# Altium integrated library Rosenberger FAKRA.IntLib: 102 symbols (continued)
## 59S2UF-40MA5-G
designator P?
FaKrA Right Angle Plug, Edge Mount Pin in Paste, Upside Down, Coding G (Grey), Up to 6 GHz, -40 to 105 degC; PartNumber: 59S2UF-40MA5-G; Design Note: Footprint in library is a generic example - only application specific footprint delivers High Performance; DatasheetVersion: b00; PackageVersion: b00; PackageReference: 59S2UF-40MA5-G; PackageDescription: FaKra-HF Right Angle Plug, Edge Mount Pin in Paste, 23.1 x 9.3 x 5.45 mm; Coding: G (Grey); Mounting Technology: Pin-in-Paste; ComponentLink1Description: Manufacturer URL; ComponentLink1URL: http://www.rosenberger.de; ComponentLink2Description: Datasheet; ComponentLink2URL: http://rosenberger.de/ok/images/documents/db/59S2UF-40MA5-Y.pdf; ComponentLink3Description: Package Specification; ComponentLink3URL: http://rosenberger.de/ok/images/documents/db/59S2UF-40MA5-Y.pdf; ComponentLink4Description: Series Overview / Design Note; ComponentLink4URL: http://rosenberger.de/ok/images/documents/spez/59fakra.pdf; ComponentLink5Description: Webshop / RFQ; ComponentLink5URL: http://www.rosenberger.com/en/contact/sales/
footprint ROS-59S2UF-40MA5-G_V (FaKra-HF Right Angle Plug, Edge Mount Pin in Paste, 23.1x9.3x5.45mm, Rosenberger Recommended)
pins: 1, MH

## 59S2UF-40MA5-H
designator P?
FaKrA Right Angle Plug, Edge Mount Pin in Paste, Upside Down, Coding H (Violet), Up to 6 GHz, -40 to 105 degC; PartNumber: 59S2UF-40MA5-H; Design Note: Footprint in library is a generic example - only application specific footprint delivers High Performance; DatasheetVersion: b00; PackageVersion: b00; PackageReference: 59S2UF-40MA5-H; PackageDescription: FaKra-HF Right Angle Plug, Edge Mount Pin in Paste, 23.1 x 9.3 x 5.45 mm; Coding: H (Violet); Mounting Technology: Pin-in-Paste; ComponentLink1Description: Manufacturer URL; ComponentLink1URL: http://www.rosenberger.de; ComponentLink2Description: Datasheet; ComponentLink2URL: http://rosenberger.de/ok/images/documents/db/59S2UF-40MA5-Y.pdf; ComponentLink3Description: Package Specification; ComponentLink3URL: http://rosenberger.de/ok/images/documents/db/59S2UF-40MA5-Y.pdf; ComponentLink4Description: Series Overview / Design Note; ComponentLink4URL: http://rosenberger.de/ok/images/documents/spez/59fakra.pdf; ComponentLink5Description: Webshop / RFQ; ComponentLink5URL: http://www.rosenberger.com/en/contact/sales/
footprint ROS-59S2UF-40MA5-H_V (FaKra-HF Right Angle Plug, Edge Mount Pin in Paste, 23.1x9.3x5.45mm, Rosenberger Recommended)
pins: 1, MH

## 59S2UF-40MA5-I
designator P?
FaKrA Right Angle Plug, Edge Mount Pin in Paste, Upside Down, Coding I (Beige), Up to 6 GHz, -40 to 105 degC; PartNumber: 59S2UF-40MA5-I; Design Note: Footprint in library is a generic example - only application specific footprint delivers High Performance; DatasheetVersion: b00; PackageVersion: b00; PackageReference: 59S2UF-40MA5-I; PackageDescription: FaKra-HF Right Angle Plug, Edge Mount Pin in Paste, 23.1 x 9.3 x 5.45 mm; Coding: I (Beige); Mounting Technology: Pin-in-Paste; ComponentLink1Description: Manufacturer URL; ComponentLink1URL: http://www.rosenberger.de; ComponentLink2Description: Datasheet; ComponentLink2URL: http://rosenberger.de/ok/images/documents/db/59S2UF-40MA5-Y.pdf; ComponentLink3Description: Package Specification; ComponentLink3URL: http://rosenberger.de/ok/images/documents/db/59S2UF-40MA5-Y.pdf; ComponentLink4Description: Series Overview / Design Note; ComponentLink4URL: http://rosenberger.de/ok/images/documents/spez/59fakra.pdf; ComponentLink5Description: Webshop / RFQ; ComponentLink5URL: http://www.rosenberger.com/en/contact/sales/
footprint ROS-59S2UF-40MA5-I_V (FaKra-HF Right Angle Plug, Edge Mount Pin in Paste, 23.1x9.3x5.45mm, Rosenberger Recommended)
pins: 1, MH

## 59S2UF-40MA5-K
designator P?
FaKrA Right Angle Plug, Edge Mount Pin in Paste, Upside Down, Coding K (Curry), Up to 6 GHz, -40 to 105 degC; PartNumber: 59S2UF-40MA5-K; Design Note: Footprint in library is a generic example - only application specific footprint delivers High Performance; DatasheetVersion: b00; PackageVersion: b00; PackageReference: 59S2UF-40MA5-K; PackageDescription: FaKra-HF Right Angle Plug, Edge Mount Pin in Paste, 23.1 x 9.3 x 5.45 mm; Coding: K (Curry); Mounting Technology: Pin-in-Paste; ComponentLink1Description: Manufacturer URL; ComponentLink1URL: http://www.rosenberger.de; ComponentLink2Description: Datasheet; ComponentLink2URL: http://rosenberger.de/ok/images/documents/db/59S2UF-40MA5-Y.pdf; ComponentLink3Description: Package Specification; ComponentLink3URL: http://rosenberger.de/ok/images/documents/db/59S2UF-40MA5-Y.pdf; ComponentLink4Description: Series Overview / Design Note; ComponentLink4URL: http://rosenberger.de/ok/images/documents/spez/59fakra.pdf; ComponentLink5Description: Webshop / RFQ; ComponentLink5URL: http://www.rosenberger.com/en/contact/sales/
footprint ROS-59S2UF-40MA5-K_V (FaKra-HF Right Angle Plug, Edge Mount Pin in Paste, 23.1x9.3x5.45mm, Rosenberger Recommended)
pins: 1, MH

## 59S2UF-40MA5-L
designator P?
FaKrA Right Angle Plug, Edge Mount Pin in Paste, Upside Down, Coding L (Carmine-Red), Up to 6 GHz, -40 to 105 degC; PartNumber: 59S2UF-40MA5-L; Design Note: Footprint in library is a generic example - only application specific footprint delivers High Performance; DatasheetVersion: b00; PackageVersion: b00; PackageReference: 59S2UF-40MA5-L; PackageDescription: FaKra-HF Right Angle Plug, Edge Mount Pin in Paste, 23.1 x 9.3 x 5.45 mm; Coding: L (Carmine-red); Mounting Technology: Pin-in-Paste; ComponentLink1Description: Manufacturer URL; ComponentLink1URL: http://www.rosenberger.de; ComponentLink2Description: Datasheet; ComponentLink2URL: http://rosenberger.de/ok/images/documents/db/59S2UF-40MA5-Y.pdf; ComponentLink3Description: Package Specification; ComponentLink3URL: http://rosenberger.de/ok/images/documents/db/59S2UF-40MA5-Y.pdf; ComponentLink4Description: Series Overview / Design Note; ComponentLink4URL: http://rosenberger.de/ok/images/documents/spez/59fakra.pdf; ComponentLink5Description: Webshop / RFQ; ComponentLink5URL: http://www.rosenberger.com/en/contact/sales/
footprint ROS-59S2UF-40MA5-L_V (FaKra-HF Right Angle Plug, Edge Mount Pin in Paste, 23.1x9.3x5.45mm, Rosenberger Recommended)
pins: 1, MH

## 59S2UF-40MA5-Z
designator P?
FaKrA Right Angle Plug, Edge Mount Pin in Paste, Upside Down, Coding Z (Waterblue), Up to 6 GHz, -40 to 105 degC; PartNumber: 59S2UF-40MA5-Z; Design Note: Footprint in library is a generic example - only application specific footprint delivers High Performance; DatasheetVersion: b00; PackageVersion: b00; PackageReference: 59S2UF-40MA5-Z; PackageDescription: FaKra-HF Right Angle Plug, Edge Mount Pin in Paste, 23.1 x 9.3 x 5.45 mm; Coding: Z (Waterblue); Mounting Technology: Pin-in-Paste; ComponentLink1Description: Manufacturer URL; ComponentLink1URL: http://www.rosenberger.de; ComponentLink2Description: Datasheet; ComponentLink2URL: http://rosenberger.de/ok/images/documents/db/59S2UF-40MA5-Y.pdf; ComponentLink3Description: Package Specification; ComponentLink3URL: http://rosenberger.de/ok/images/documents/db/59S2UF-40MA5-Y.pdf; ComponentLink4Description: Series Overview / Design Note; ComponentLink4URL: http://rosenberger.de/ok/images/documents/spez/59fakra.pdf; ComponentLink5Description: Webshop / RFQ; ComponentLink5URL: http://www.rosenberger.com/en/contact/sales/
footprint ROS-59S2UF-40MA5-Z_V (FaKra-HF Right Angle Plug, Edge Mount Pin in Paste, 23.1x9.3x5.45mm, Rosenberger Recommended)
pins: 1, MH

## 59S2UQ-40MT5-C
designator P?
FaKrA Right Angle Plug, Edge Mount Pin in Paste, Upside Down, Coding C (Blue), Up to 6 GHz, -40 to 105 degC; PartNumber: 59S2UQ-40MT5-C; Design Note: Footprint in library is a generic example - only application specific footprint delivers High Performance; DatasheetVersion: c00; PackageVersion: c00; PackageReference: 59S2UQ-40MT5-C; PackageDescription: FaKrA-HF Right Angle Plug, Edge Mount Pin in Paste, 8.5 x 22.65 x 3.8 mm; Coding: C (Blue); Mounting Technology: Pin-in-Paste; ComponentLink1Description: Manufacturer URL; ComponentLink1URL: http://www.rosenberger.de; ComponentLink2Description: Datasheet; ComponentLink2URL: http://rosenberger.de/ok/images/documents/db/59S2UQ-40MT5-Y.pdf; ComponentLink3Description: Package Specification; ComponentLink3URL: http://rosenberger.de/ok/images/documents/db/59S2UQ-40MT5-Y.pdf; ComponentLink4Description: Webshop / RFQ; ComponentLink4URL: http://www.rosenberger.com/en/contact/sales/
footprint ROS-59S2UQ-40MT5-I_V (FaKrA-HF Right Angle Plug, Edge Mount Pin in Paste, 8.5x22.65x3.8mm, Rosenberger Recommended)
pins: 1, MH

## 59S2UQ-40MT5-I
designator P?
FaKrA Right Angle Plug, Edge Mount Pin in Paste, Upside Down, Coding I (Beige), Up to 6 GHz, -40 to 105 degC; PartNumber: 59S2UQ-40MT5-I; Design Note: Footprint in library is a generic example - only application specific footprint delivers High Performance; DatasheetVersion: c00; PackageVersion: c00; PackageReference: 59S2UQ-40MT5-I; PackageDescription: FaKrA-HF Right Angle Plug, Edge Mount Pin in Paste, 8.5 x 22.65 x 3.8 mm; Coding: I (Beige); Mounting Technology: Pin-in-Paste; ComponentLink1Description: Manufacturer URL; ComponentLink1URL: http://www.rosenberger.de; ComponentLink2Description: Datasheet; ComponentLink2URL: http://rosenberger.de/ok/images/documents/db/59S2UQ-40MT5-Y.pdf; ComponentLink3Description: Package Specification; ComponentLink3URL: http://rosenberger.de/ok/images/documents/db/59S2UQ-40MT5-Y.pdf; ComponentLink4Description: Webshop / RFQ; ComponentLink4URL: http://www.rosenberger.com/en/contact/sales/
footprint ROS-59S2UQ-40MT5-C_V (FaKrA-HF Right Angle Plug, Edge Mount Pin in Paste, 8.5x22.65x3.8mm, Rosenberger Recommended)
pins: 1, MH

## 59S2UQ-40MT5-K
designator P?
FaKrA Right Angle Plug, Edge Mount Pin in Paste, Upside Down, Coding K (Curry), Up to 6 GHz, -40 to 105 degC; PartNumber: 59S2UQ-40MT5-K; Design Note: Footprint in library is a generic example - only application specific footprint delivers High Performance; DatasheetVersion: c00; PackageVersion: c00; PackageReference: 59S2UQ-40MT5-K; PackageDescription: FaKrA-HF Right Angle Plug, Edge Mount Pin in Paste, 8.5 x 22.65 x 3.8 mm; Coding: K (Curry); Mounting Technology: Pin-in-Paste; ComponentLink1Description: Manufacturer URL; ComponentLink1URL: http://www.rosenberger.de; ComponentLink2Description: Datasheet; ComponentLink2URL: http://rosenberger.de/ok/images/documents/db/59S2UQ-40MT5-Y.pdf; ComponentLink3Description: Package Specification; ComponentLink3URL: http://rosenberger.de/ok/images/documents/db/59S2UQ-40MT5-Y.pdf; ComponentLink4Description: Webshop / RFQ; ComponentLink4URL: http://www.rosenberger.com/en/contact/sales/
footprint ROS-59S2UQ-40MT5-K_V (FaKrA-HF Right Angle Plug, Edge Mount Pin in Paste, 8.5x22.65x3.8mm, Rosenberger Recommended)
pins: 1, MH

## 59S2UQ-40MT5-Z
designator P?
FaKrA Right Angle Plug, Edge Mount Pin in Paste, Upside Down, Coding Z (Waterblue), Up to 6 GHz, -40 to 105 degC; PartNumber: 59S2UQ-40MT5-Z; Coding: Z (Waterbule); Design Note: Footprint in library is a generic example - only application specific footprint delivers High Performance; DatasheetVersion: c00; PackageVersion: c00; PackageReference: 59S2UQ-40MT5-Z; PackageDescription: FaKrA-HF Right Angle Plug, Edge Mount Pin in Paste, 8.5 x 22.65 x 3.8 mm; Mounting Technology: Pin-in-Paste; ComponentLink1Description: Manufacturer URL; ComponentLink1URL: http://www.rosenberger.de; ComponentLink2Description: Datasheet; ComponentLink2URL: http://rosenberger.de/ok/images/documents/db/59S2UQ-40MT5-Y.pdf; ComponentLink3Description: Package Specification; ComponentLink3URL: http://rosenberger.de/ok/images/documents/db/59S2UQ-40MT5-Y.pdf; ComponentLink4Description: Webshop / RFQ; ComponentLink4URL: http://www.rosenberger.com/en/contact/sales/
footprint ROS-59S2UQ-40MT5-Z_V (FaKrA-HF Right Angle Plug, Edge Mount Pin in Paste, 8.5x22.65x3.8mm, Rosenberger Recommended)
pins: 1, MH

## 59S20X-400L5-A
designator P?
FaKrA Right Angle Plug, Pin in Paste, Coding A (Black), Up to 6 GHz, -40 to 105 degC; PartNumber: 59S20X-400L5-A; Design Note: Footprint in library is a generic example - only application specific footprint delivers High Performance; DatasheetVersion: j00; PackageVersion: j00; PackageReference: 59S20X-400L5-A; PackageDescription: FaKrA Right Angle Plug, Pin in Paste, 16.6 x 8.5 x 9.4 mm; Coding: A (Black); Mounting Technology: Pin-in-Paste; ComponentLink1Description: Manufacturer URL; ComponentLink1URL: http://www.rosenberger.de; ComponentLink2Description: Datasheet; ComponentLink2URL: http://rosenberger.de/ok/images/documents/db/59S20X-400L5-Y.pdf; ComponentLink3Description: Package Specification; ComponentLink3URL: http://rosenberger.de/ok/images/documents/db/59S20X-400L5-Y.pdf; ComponentLink4Description: Series Overview / Design Note; ComponentLink4URL: http://rosenberger.de/ok/images/documents/spez/59fakra.pdf; ComponentLink5Description: Webshop / RFQ; ComponentLink5URL: http://www.rosenberger.com/en/contact/sales/
footprint ROS-59S20X-400L5-A_V (FaKrA Right Angle Plug, Pin in Paste, 16.6x8.5x9.4mm, Rosenberger Recommended)
pins: 1, MH

## 59S20X-400L5-B
designator P?
FaKrA Right Angle Plug, Pin in Paste, Coding B (White), Up to 6 GHz, -40 to 105 degC; PartNumber: 59S20X-400L5-B; Design Note: Footprint in library is a generic example - only application specific footprint delivers High Performance; DatasheetVersion: j00; PackageVersion: j00; PackageReference: 59S20X-400L5-B; PackageDescription: FaKrA Right Angle Plug, Pin in Paste, 16.6 x 8.5 x 9.4 mm; Coding: B (White); Mounting Technology: Pin-in-Paste; ComponentLink1Description: Manufacturer URL; ComponentLink1URL: http://www.rosenberger.de; ComponentLink2Description: Datasheet; ComponentLink2URL: http://rosenberger.de/ok/images/documents/db/59S20X-400L5-Y.pdf; ComponentLink3Description: Package Specification; ComponentLink3URL: http://rosenberger.de/ok/images/documents/db/59S20X-400L5-Y.pdf; ComponentLink4Description: Series Overview / Design Note; ComponentLink4URL: http://rosenberger.de/ok/images/documents/spez/59fakra.pdf; ComponentLink5Description: Webshop / RFQ; ComponentLink5URL: http://www.rosenberger.com/en/contact/sales/
footprint ROS-59S20X-400L5-B_V (FaKrA Right Angle Plug, Pin in Paste, 16.6x8.5x9.4mm, Rosenberger Recommended)
pins: 1, MH

## 59S20X-400L5-C
designator P?
FaKrA Right Angle Plug, Pin in Paste, Coding C (Blue), Up to 6 GHz, -40 to 105 degC; PartNumber: 59S20X-400L5-C; Design Note: Footprint in library is a generic example - only application specific footprint delivers High Performance; DatasheetVersion: j00; PackageVersion: j00; PackageReference: 59S20X-400L5-C; PackageDescription: FaKrA Right Angle Plug, Pin in Paste, 16.6 x 8.5 x 9.4 mm; Coding: C (Blue); Mounting Technology: Pin-in-Paste; ComponentLink1Description: Manufacturer URL; ComponentLink1URL: http://www.rosenberger.de; ComponentLink2Description: Datasheet; ComponentLink2URL: http://rosenberger.de/ok/images/documents/db/59S20X-400L5-Y.pdf; ComponentLink3Description: Package Specification; ComponentLink3URL: http://rosenberger.de/ok/images/documents/db/59S20X-400L5-Y.pdf; ComponentLink4Description: Series Overview / Design Note; ComponentLink4URL: http://rosenberger.de/ok/images/documents/spez/59fakra.pdf; ComponentLink5Description: Webshop / RFQ; ComponentLink5URL: http://www.rosenberger.com/en/contact/sales/
footprint ROS-59S20X-400L5-C_V (FaKrA Right Angle Plug, Pin in Paste, 16.6x8.5x9.4mm, Rosenberger Recommended)
pins: 1, MH

## 59S20X-400L5-D
designator P?
FaKrA Right Angle Plug, Pin in Paste, Coding D (Bordeauxviolet), Up to 6 GHz, -40 to 105 degC; PartNumber: 59S20X-400L5-D; Design Note: Footprint in library is a generic example - only application specific footprint delivers High Performance; DatasheetVersion: j00; PackageVersion: j00; PackageReference: 59S20X-400L5-D; PackageDescription: FaKrA Right Angle Plug, Pin in Paste, 16.6 x 8.5 x 9.4 mm; Coding: D (Bordeauxviolet); Mounting Technology: Pin-in-Paste; ComponentLink1Description: Manufacturer URL; ComponentLink1URL: http://www.rosenberger.de; ComponentLink2Description: Datasheet; ComponentLink2URL: http://rosenberger.de/ok/images/documents/db/59S20X-400L5-Y.pdf; ComponentLink3Description: Package Specification; ComponentLink3URL: http://rosenberger.de/ok/images/documents/db/59S20X-400L5-Y.pdf; ComponentLink4Description: Series Overview / Design Note; ComponentLink4URL: http://rosenberger.de/ok/images/documents/spez/59fakra.pdf; ComponentLink5Description: Webshop / RFQ; ComponentLink5URL: http://www.rosenberger.com/en/contact/sales/
footprint ROS-59S20X-400L5-D_V (FaKrA Right Angle Plug, Pin in Paste, 16.6x8.5x9.4mm, Rosenberger Recommended)
pins: 1, MH

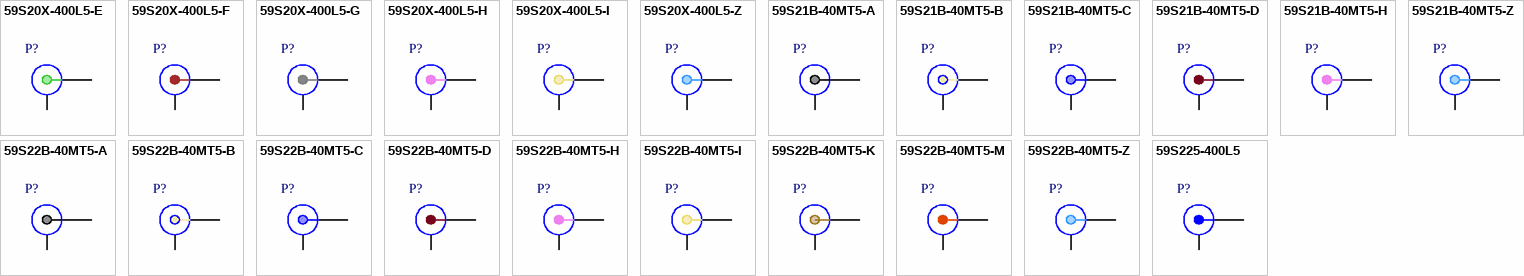
[diagram p2: symbols 59S20X-400L5-E to 59S225-400L5]

## 59S20X-400L5-E
designator P?
FaKrA Right Angle Plug, Pin in Paste, Coding E (Green), Up to 6 GHz, -40 to 105 degC; PartNumber: 59S20X-400L5-E; Design Note: Footprint in library is a generic example - only application specific footprint delivers High Performance; DatasheetVersion: j00; PackageVersion: j00; PackageReference: 59S20X-400L5-E; PackageDescription: FaKrA Right Angle Plug, Pin in Paste, 16.6 x 8.5 x 9.4 mm; Coding: E (Green); Mounting Technology: Pin-in-Paste; ComponentLink1Description: Manufacturer URL; ComponentLink1URL: http://www.rosenberger.de; ComponentLink2Description: Datasheet; ComponentLink2URL: http://rosenberger.de/ok/images/documents/db/59S20X-400L5-Y.pdf; ComponentLink3Description: Package Specification; ComponentLink3URL: http://rosenberger.de/ok/images/documents/db/59S20X-400L5-Y.pdf; ComponentLink4Description: Series Overview / Design Note; ComponentLink4URL: http://rosenberger.de/ok/images/documents/spez/59fakra.pdf; ComponentLink5Description: Webshop / RFQ; ComponentLink5URL: http://www.rosenberger.com/en/contact/sales/
footprint ROS-59S20X-400L5-E_V (FaKrA Right Angle Plug, Pin in Paste, 16.6x8.5x9.4mm, Rosenberger Recommended)
pins: 1, MH

## 59S20X-400L5-F
designator P?
FaKrA Right Angle Plug, Pin in Paste, Coding F (Brown), Up to 6 GHz, -40 to 105 degC; PartNumber: 59S20X-400L5-F; Design Note: Footprint in library is a generic example - only application specific footprint delivers High Performance; DatasheetVersion: j00; PackageVersion: j00; PackageReference: 59S20X-400L5-F; PackageDescription: FaKrA Right Angle Plug, Pin in Paste, 16.6 x 8.5 x 9.4 mm; Coding: F (Brown); Mounting Technology: Pin-in-Paste; ComponentLink1Description: Manufacturer URL; ComponentLink1URL: http://www.rosenberger.de; ComponentLink2Description: Datasheet; ComponentLink2URL: http://rosenberger.de/ok/images/documents/db/59S20X-400L5-Y.pdf; ComponentLink3Description: Package Specification; ComponentLink3URL: http://rosenberger.de/ok/images/documents/db/59S20X-400L5-Y.pdf; ComponentLink4Description: Series Overview / Design Note; ComponentLink4URL: http://rosenberger.de/ok/images/documents/spez/59fakra.pdf; ComponentLink5Description: Webshop / RFQ; ComponentLink5URL: http://www.rosenberger.com/en/contact/sales/
footprint ROS-59S20X-400L5-F_V (FaKrA Right Angle Plug, Pin in Paste, 16.6x8.5x9.4mm, Rosenberger Recommended)
pins: 1, MH

## 59S20X-400L5-G
designator P?
FaKrA Right Angle Plug, Pin in Paste, Coding G (Grey), Up to 6 GHz, -40 to 105 degC; PartNumber: 59S20X-400L5-G; Design Note: Footprint in library is a generic example - only application specific footprint delivers High Performance; DatasheetVersion: j00; PackageVersion: j00; PackageReference: 59S20X-400L5-G; PackageDescription: FaKrA Right Angle Plug, Pin in Paste, 16.6 x 8.5 x 9.4 mm; Coding: G (Grey); Mounting Technology: Pin-in-Paste; ComponentLink1Description: Manufacturer URL; ComponentLink1URL: http://www.rosenberger.de; ComponentLink2Description: Datasheet; ComponentLink2URL: http://rosenberger.de/ok/images/documents/db/59S20X-400L5-Y.pdf; ComponentLink3Description: Package Specification; ComponentLink3URL: http://rosenberger.de/ok/images/documents/db/59S20X-400L5-Y.pdf; ComponentLink4Description: Series Overview / Design Note; ComponentLink4URL: http://rosenberger.de/ok/images/documents/spez/59fakra.pdf; ComponentLink5Description: Webshop / RFQ; ComponentLink5URL: http://www.rosenberger.com/en/contact/sales/
footprint ROS-59S20X-400L5-G_V (FaKrA Right Angle Plug, Pin in Paste, 16.6x8.5x9.4mm, Rosenberger Recommended)
pins: 1, MH

## 59S20X-400L5-H
designator P?
FaKrA Right Angle Plug, Pin in Paste, Coding H (Violet), Up to 6 GHz, -40 to 105 degC; PartNumber: 59S20X-400L5-H; Design Note: Footprint in library is a generic example - only application specific footprint delivers High Performance; DatasheetVersion: j00; PackageVersion: j00; PackageReference: 59S20X-400L5-H; PackageDescription: FaKrA Right Angle Plug, Pin in Paste, 16.6 x 8.5 x 9.4 mm; Coding: H (Violet); Mounting Technology: Pin-in-Paste; ComponentLink1Description: Manufacturer URL; ComponentLink1URL: http://www.rosenberger.de; ComponentLink2Description: Datasheet; ComponentLink2URL: http://rosenberger.de/ok/images/documents/db/59S20X-400L5-Y.pdf; ComponentLink3Description: Package Specification; ComponentLink3URL: http://rosenberger.de/ok/images/documents/db/59S20X-400L5-Y.pdf; ComponentLink4Description: Series Overview / Design Note; ComponentLink4URL: http://rosenberger.de/ok/images/documents/spez/59fakra.pdf; ComponentLink5Description: Webshop / RFQ; ComponentLink5URL: http://www.rosenberger.com/en/contact/sales/
footprint ROS-59S20X-400L5-H_V (FaKrA Right Angle Plug, Pin in Paste, 16.6x8.5x9.4mm, Rosenberger Recommended)
pins: 1, MH

## 59S20X-400L5-I
designator P?
FaKrA Right Angle Plug, Pin in Paste, Coding I (Beige), Up to 6 GHz, -40 to 105 degC; PartNumber: 59S20X-400L5-I; Design Note: Footprint in library is a generic example - only application specific footprint delivers High Performance; DatasheetVersion: j00; PackageVersion: j00; PackageReference: 59S20X-400L5-I; PackageDescription: FaKrA Right Angle Plug, Pin in Paste, 16.6 x 8.5 x 9.4 mm; Coding: I (Beige); Mounting Technology: Pin-in-Paste; ComponentLink1Description: Manufacturer URL; ComponentLink1URL: http://www.rosenberger.de; ComponentLink2Description: Datasheet; ComponentLink2URL: http://rosenberger.de/ok/images/documents/db/59S20X-400L5-Y.pdf; ComponentLink3Description: Package Specification; ComponentLink3URL: http://rosenberger.de/ok/images/documents/db/59S20X-400L5-Y.pdf; ComponentLink4Description: Series Overview / Design Note; ComponentLink4URL: http://rosenberger.de/ok/images/documents/spez/59fakra.pdf; ComponentLink5Description: Webshop / RFQ; ComponentLink5URL: http://www.rosenberger.com/en/contact/sales/
footprint ROS-59S20X-400L5-I_V (FaKrA Right Angle Plug, Pin in Paste, 16.6x8.5x9.4mm, Rosenberger Recommended)
pins: 1, MH

## 59S20X-400L5-Z
designator P?
FaKrA Right Angle Plug, Pin in Paste, Coding Z (Waterblue), Up to 6 GHz, -40 to 105 degC; PartNumber: 59S20X-400L5-Z; Design Note: Footprint in library is a generic example - only application specific footprint delivers High Performance; DatasheetVersion: j00; PackageVersion: j00; PackageReference: 59S20X-400L5-Z; PackageDescription: FaKrA Right Angle Plug, Pin in Paste, 16.6 x 8.5 x 9.4 mm; Coding: Z (Waterblue); Mounting Technology: Pin-in-Paste; ComponentLink1Description: Manufacturer URL; ComponentLink1URL: http://www.rosenberger.de; ComponentLink2Description: Datasheet; ComponentLink2URL: http://rosenberger.de/ok/images/documents/db/59S20X-400L5-Y.pdf; ComponentLink3Description: Package Specification; ComponentLink3URL: http://rosenberger.de/ok/images/documents/db/59S20X-400L5-Y.pdf; ComponentLink4Description: Series Overview / Design Note; ComponentLink4URL: http://rosenberger.de/ok/images/documents/spez/59fakra.pdf; ComponentLink5Description: Webshop / RFQ; ComponentLink5URL: http://www.rosenberger.com/en/contact/sales/
footprint ROS-59S20X-400L5-Z_V (FaKrA Right Angle Plug, Pin in Paste, 16.6x8.5x9.4mm, Rosenberger Recommended)
pins: 1, MH

## 59S21B-40MT5-A
designator P?
FaKrA Right Angle Plug, Edge Mount Pin in Paste, Upside Down, Coding A (Black), Up to 6 GHz, -40 to 105 degC; PartNumber: 59S21B-40MT5-A; Design Note: Footprint in library is a generic example - only application specific footprint delivers High Performance; DatasheetVersion: a00; PackageVersion: a00; PackageReference: 59S21B-40MT5-A; PackageDescription: FaKrA Right Angle Plug, Edge Mount Pin in Paste, 22.75 x 8 x 9.8 mm; Coding: A (Black); Mounting Technology: Pin-in-Paste; ComponentLink1Description: Manufacturer URL; ComponentLink1URL: http://www.rosenberger.de; ComponentLink2Description: Datasheet; ComponentLink2URL: http://rosenberger.de/ok/images/documents/db/59S21B-40MT5-Y.pdf; ComponentLink3Description: Package Specification; ComponentLink3URL: http://rosenberger.de/ok/images/documents/db/59S21B-40MT5-Y.pdf; ComponentLink4Description: Series Overview / Design Note; ComponentLink4URL: http://rosenberger.de/ok/images/documents/spez/59fakra.pdf; ComponentLink5Description: Webshop / RFQ; ComponentLink5URL: http://www.rosenberger.com/en/contact/sales/
footprint ROS-59S21B-40MT5-A_V (FaKrA Right Angle Plug, Edge Mount Pin in Paste, 22.75x8x9.8mm, Rosenberger Recommended)
pins: 1, MH

## 59S21B-40MT5-B
designator P?
FaKrA Right Angle Plug, Edge Mount Pin in Paste, Upside Down, Coding B (White), Up to 6 GHz, -40 to 105 degC; PartNumber: 59S21B-40MT5-B; Design Note: Footprint in library is a generic example - only application specific footprint delivers High Performance; DatasheetVersion: a00; PackageVersion: a00; PackageReference: 59S21B-40MT5-B; PackageDescription: FaKrA Right Angle Plug, Edge Mount Pin in Paste, 22.75 x 8 x 9.8 mm; Coding: B (White); Mounting Technology: Pin-in-Paste; ComponentLink1Description: Manufacturer URL; ComponentLink1URL: http://www.rosenberger.de; ComponentLink2Description: Datasheet; ComponentLink2URL: http://rosenberger.de/ok/images/documents/db/59S21B-40MT5-Y.pdf; ComponentLink3Description: Package Specification; ComponentLink3URL: http://rosenberger.de/ok/images/documents/db/59S21B-40MT5-Y.pdf; ComponentLink4Description: Series Overview / Design Note; ComponentLink4URL: http://rosenberger.de/ok/images/documents/spez/59fakra.pdf; ComponentLink5Description: Webshop / RFQ; ComponentLink5URL: http://www.rosenberger.com/en/contact/sales/
footprint ROS-59S21B-40MT5-B_V (FaKrA Right Angle Plug, Edge Mount Pin in Paste, 22.75x8x9.8mm, Rosenberger Recommended)
pins: 1, MH

## 59S21B-40MT5-C
designator P?
FaKrA Right Angle Plug, Edge Mount Pin in Paste, Upside Down, Coding C (Blue), Up to 6 GHz, -40 to 105 degC; PartNumber: 59S21B-40MT5-C; Design Note: Footprint in library is a generic example - only application specific footprint delivers High Performance; DatasheetVersion: a00; PackageVersion: a00; PackageReference: 59S21B-40MT5-C; PackageDescription: FaKrA Right Angle Plug, Edge Mount Pin in Paste, 22.75 x 8 x 9.8 mm; Coding: C (Blue); Mounting Technology: Pin-in-Paste; ComponentLink1Description: Manufacturer URL; ComponentLink1URL: http://www.rosenberger.de; ComponentLink2Description: Datasheet; ComponentLink2URL: http://rosenberger.de/ok/images/documents/db/59S21B-40MT5-Y.pdf; ComponentLink3Description: Package Specification; ComponentLink3URL: http://rosenberger.de/ok/images/documents/db/59S21B-40MT5-Y.pdf; ComponentLink4Description: Series Overview / Design Note; ComponentLink4URL: http://rosenberger.de/ok/images/documents/spez/59fakra.pdf; ComponentLink5Description: Webshop / RFQ; ComponentLink5URL: http://www.rosenberger.com/en/contact/sales/
footprint ROS-59S21B-40MT5-C_V (FaKrA Right Angle Plug, Edge Mount Pin in Paste, 22.75x8x9.8mm, Rosenberger Recommended)
pins: 1, MH

## 59S21B-40MT5-D
designator P?
FaKrA Right Angle Plug, Edge Mount Pin in Paste, Upside Down, Coding D (Bordeauxviolet), Up to 6 GHz, -40 to 105 degC; PartNumber: 59S21B-40MT5-D; Design Note: Footprint in library is a generic example - only application specific footprint delivers High Performance; DatasheetVersion: a00; PackageVersion: a00; PackageReference: 59S21B-40MT5-D; PackageDescription: FaKrA Right Angle Plug, Edge Mount Pin in Paste, 22.75 x 8 x 9.8 mm; Coding: D (Bordeauxviolet); Mounting Technology: Pin-in-Paste; ComponentLink1Description: Manufacturer URL; ComponentLink1URL: http://www.rosenberger.de; ComponentLink2Description: Datasheet; ComponentLink2URL: http://rosenberger.de/ok/images/documents/db/59S21B-40MT5-Y.pdf; ComponentLink3Description: Package Specification; ComponentLink3URL: http://rosenberger.de/ok/images/documents/db/59S21B-40MT5-Y.pdf; ComponentLink4Description: Series Overview / Design Note; ComponentLink4URL: http://rosenberger.de/ok/images/documents/spez/59fakra.pdf; ComponentLink5Description: Webshop / RFQ; ComponentLink5URL: http://www.rosenberger.com/en/contact/sales/
footprint ROS-59S21B-40MT5-D_V (FaKrA Right Angle Plug, Edge Mount Pin in Paste, 22.75x8x9.8mm, Rosenberger Recommended)
pins: 1, MH

## 59S21B-40MT5-H
designator P?
FaKrA Right Angle Plug, Edge Mount Pin in Paste, Upside Down, Coding H (Violet), Up to 6 GHz, -40 to 105 degC; PartNumber: 59S21B-40MT5-H; Design Note: Footprint in library is a generic example - only application specific footprint delivers High Performance; DatasheetVersion: a00; PackageVersion: a00; PackageReference: 59S21B-40MT5-H; PackageDescription: FaKrA Right Angle Plug, Edge Mount Pin in Paste, 22.75 x 8 x 9.8 mm; Coding: H (Violet); Mounting Technology: Pin-in-Paste; ComponentLink1Description: Manufacturer URL; ComponentLink1URL: http://www.rosenberger.de; ComponentLink2Description: Datasheet; ComponentLink2URL: http://rosenberger.de/ok/images/documents/db/59S21B-40MT5-Y.pdf; ComponentLink3Description: Package Specification; ComponentLink3URL: http://rosenberger.de/ok/images/documents/db/59S21B-40MT5-Y.pdf; ComponentLink4Description: Series Overview / Design Note; ComponentLink4URL: http://rosenberger.de/ok/images/documents/spez/59fakra.pdf; ComponentLink5Description: Webshop / RFQ; ComponentLink5URL: http://www.rosenberger.com/en/contact/sales/
footprint ROS-59S21B-40MT5-H_V (FaKrA Right Angle Plug, Edge Mount Pin in Paste, 22.75x8x9.8mm, Rosenberger Recommended)
pins: 1, MH

## 59S21B-40MT5-Z
designator P?
FaKrA Right Angle Plug, Edge Mount Pin in Paste, Upside Down, Coding Z (Waterblue), Up to 6 GHz, -40 to 105 degC; PartNumber: 59S21B-40MT5-Z; Design Note: Footprint in library is a generic example - only application specific footprint delivers High Performance; DatasheetVersion: a00; PackageVersion: a00; PackageReference: 59S21B-40MT5-Z; PackageDescription: FaKrA Right Angle Plug, Edge Mount Pin in Paste, 22.75 x 8 x 9.8 mm; Coding: Z (Waterblue); Mounting Technology: Pin-in-Paste; ComponentLink1Description: Manufacturer URL; ComponentLink1URL: http://www.rosenberger.de; ComponentLink2Description: Datasheet; ComponentLink2URL: http://rosenberger.de/ok/images/documents/db/59S21B-40MT5-Y.pdf; ComponentLink3Description: Package Specification; ComponentLink3URL: http://rosenberger.de/ok/images/documents/db/59S21B-40MT5-Y.pdf; ComponentLink4Description: Series Overview / Design Note; ComponentLink4URL: http://rosenberger.de/ok/images/documents/spez/59fakra.pdf; ComponentLink5Description: Webshop / RFQ; ComponentLink5URL: http://www.rosenberger.com/en/contact/sales/
footprint ROS-59S21B-40MT5-Z_V (FaKrA Right Angle Plug, Edge Mount Pin in Paste, 22.75x8x9.8mm, Rosenberger Recommended)
pins: 1, MH

## 59S22B-40MT5-A
designator P?
FaKrA Right Angle Plug, Pin in Paste, Coding A (Black), Up to 6 GHz, -40 to 105 degC; PartNumber: 59S22B-40MT5-A; Design Note: Footprint in library is a generic example - only application specific footprint delivers High Performance; DatasheetVersion: b00; PackageVersion: b00; PackageReference: 59S22B-40MT5-A; PackageDescription: FaKra-HF Right Angle Plug, Pin in Paste, 22.75 x 8 x 9.8 mm; Coding: A (Black); Mounting Technology: Pin-in-Paste; ComponentLink1Description: Manufacturer URL; ComponentLink1URL: http://www.rosenberger.de; ComponentLink2Description: Datasheet; ComponentLink2URL: http://rosenberger.de/ok/images/documents/db/59S22B-40MT5-Y.pdf; ComponentLink3Description: Package Specification; ComponentLink3URL: http://rosenberger.de/ok/images/documents/db/59S22B-40MT5-Y.pdf; ComponentLink4Description: Series Overview / Design Note; ComponentLink4URL: http://rosenberger.de/ok/images/documents/spez/59fakra.pdf; ComponentLink5Description: Webshop / RFQ; ComponentLink5URL: http://www.rosenberger.com/en/contact/sales/
footprint ROS-59S22B-40MT5-A_V (FaKra-HF Right Angle Plug, Pin in Paste, 22.75x8x9.8mm, Rosenberger Recommended)
pins: 1, MH

## 59S22B-40MT5-B
designator P?
FaKrA Right Angle Plug, Pin in Paste, Coding B (White), Up to 6 GHz, -40 to 105 degC; PartNumber: 59S22B-40MT5-B; Design Note: Footprint in library is a generic example - only application specific footprint delivers High Performance; DatasheetVersion: b00; PackageVersion: b00; PackageReference: 59S22B-40MT5-B; PackageDescription: FaKra-HF Right Angle Plug, Pin in Paste, 22.75 x 8 x 9.8 mm; Coding: B (White); Mounting Technology: Pin-in-Paste; ComponentLink1Description: Manufacturer URL; ComponentLink1URL: http://www.rosenberger.de; ComponentLink2Description: Datasheet; ComponentLink2URL: http://rosenberger.de/ok/images/documents/db/59S22B-40MT5-Y.pdf; ComponentLink3Description: Package Specification; ComponentLink3URL: http://rosenberger.de/ok/images/documents/db/59S22B-40MT5-Y.pdf; ComponentLink4Description: Series Overview / Design Note; ComponentLink4URL: http://rosenberger.de/ok/images/documents/spez/59fakra.pdf; ComponentLink5Description: Webshop / RFQ; ComponentLink5URL: http://www.rosenberger.com/en/contact/sales/
footprint ROS-59S22B-40MT5-B_V (FaKra-HF Right Angle Plug, Pin in Paste, 22.75x8x9.8mm, Rosenberger Recommended)
pins: 1, MH

## 59S22B-40MT5-C
designator P?
FaKrA Right Angle Plug, Pin in Paste, Coding C (Blue), Up to 6 GHz, -40 to 105 degC; PartNumber: 59S22B-40MT5-C; Design Note: Footprint in library is a generic example - only application specific footprint delivers High Performance; DatasheetVersion: b00; PackageVersion: b00; PackageReference: 59S22B-40MT5-C; PackageDescription: FaKra-HF Right Angle Plug, Pin in Paste, 22.75 x 8 x 9.8 mm; Coding: C (Blue); Mounting Technology: Pin-in-Paste; ComponentLink1Description: Manufacturer URL; ComponentLink1URL: http://www.rosenberger.de; ComponentLink2Description: Datasheet; ComponentLink2URL: http://rosenberger.de/ok/images/documents/db/59S22B-40MT5-Y.pdf; ComponentLink3Description: Package Specification; ComponentLink3URL: http://rosenberger.de/ok/images/documents/db/59S22B-40MT5-Y.pdf; ComponentLink4Description: Series Overview / Design Note; ComponentLink4URL: http://rosenberger.de/ok/images/documents/spez/59fakra.pdf; ComponentLink5Description: Webshop / RFQ; ComponentLink5URL: http://www.rosenberger.com/en/contact/sales/
footprint ROS-59S22B-40MT5-C_V (FaKra-HF Right Angle Plug, Pin in Paste, 22.75x8x9.8mm, Rosenberger Recommended)
pins: 1, MH

## 59S22B-40MT5-D
designator P?
FaKrA Right Angle Plug, Pin in Paste, Coding D (Bordeauxviolet), Up to 6 GHz, -40 to 105 degC; PartNumber: 59S22B-40MT5-D; Design Note: Footprint in library is a generic example - only application specific footprint delivers High Performance; DatasheetVersion: b00; PackageVersion: b00; PackageReference: 59S22B-40MT5-D; PackageDescription: FaKra-HF Right Angle Plug, Pin in Paste, 22.75 x 8 x 9.8 mm; Coding: D (Bordeauxviolet); Mounting Technology: Pin-in-Paste; ComponentLink1Description: Manufacturer URL; ComponentLink1URL: http://www.rosenberger.de; ComponentLink2Description: Datasheet; ComponentLink2URL: http://rosenberger.de/ok/images/documents/db/59S22B-40MT5-Y.pdf; ComponentLink3Description: Package Specification; ComponentLink3URL: http://rosenberger.de/ok/images/documents/db/59S22B-40MT5-Y.pdf; ComponentLink4Description: Series Overview / Design Note; ComponentLink4URL: http://rosenberger.de/ok/images/documents/spez/59fakra.pdf; ComponentLink5Description: Webshop / RFQ; ComponentLink5URL: http://www.rosenberger.com/en/contact/sales/
footprint ROS-59S22B-40MT5-D_V (FaKra-HF Right Angle Plug, Pin in Paste, 22.75x8x9.8mm, Rosenberger Recommended)
pins: 1, MH

## 59S22B-40MT5-H
designator P?
FaKrA Right Angle Plug, Pin in Paste, Coding H (Violet), Up to 6 GHz, -40 to 105 degC; PartNumber: 59S22B-40MT5-H; Design Note: Footprint in library is a generic example - only application specific footprint delivers High Performance; DatasheetVersion: b00; PackageVersion: b00; PackageReference: 59S22B-40MT5-H; PackageDescription: FaKra-HF Right Angle Plug, Pin in Paste, 22.75 x 8 x 9.8 mm; Coding: H (Violet); Mounting Technology: Pin-in-Paste; ComponentLink1Description: Manufacturer URL; ComponentLink1URL: http://www.rosenberger.de; ComponentLink2Description: Datasheet; ComponentLink2URL: http://rosenberger.de/ok/images/documents/db/59S22B-40MT5-Y.pdf; ComponentLink3Description: Package Specification; ComponentLink3URL: http://rosenberger.de/ok/images/documents/db/59S22B-40MT5-Y.pdf; ComponentLink4Description: Series Overview / Design Note; ComponentLink4URL: http://rosenberger.de/ok/images/documents/spez/59fakra.pdf; ComponentLink5Description: Webshop / RFQ; ComponentLink5URL: http://www.rosenberger.com/en/contact/sales/
footprint ROS-59S22B-40MT5-H_V (FaKra-HF Right Angle Plug, Pin in Paste, 22.75x8x9.8mm, Rosenberger Recommended)
pins: 1, MH

## 59S22B-40MT5-I
designator P?
FaKrA Right Angle Plug, Pin in Paste, Coding I (Beige), Up to 6 GHz, -40 to 105 degC; PartNumber: 59S22B-40MT5-I; Design Note: Footprint in library is a generic example - only application specific footprint delivers High Performance; DatasheetVersion: b00; PackageVersion: b00; PackageReference: 59S22B-40MT5-I; PackageDescription: FaKra-HF Right Angle Plug, Pin in Paste, 22.75 x 8 x 9.8 mm; Coding: I (Beige); Mounting Technology: Pin-in-Paste; ComponentLink1Description: Manufacturer URL; ComponentLink1URL: http://www.rosenberger.de; ComponentLink2Description: Datasheet; ComponentLink2URL: http://rosenberger.de/ok/images/documents/db/59S22B-40MT5-Y.pdf; ComponentLink3Description: Package Specification; ComponentLink3URL: http://rosenberger.de/ok/images/documents/db/59S22B-40MT5-Y.pdf; ComponentLink4Description: Series Overview / Design Note; ComponentLink4URL: http://rosenberger.de/ok/images/documents/spez/59fakra.pdf; ComponentLink5Description: Webshop / RFQ; ComponentLink5URL: http://www.rosenberger.com/en/contact/sales/
footprint ROS-59S22B-40MT5-I_V (FaKra-HF Right Angle Plug, Pin in Paste, 22.75x8x9.8mm, Rosenberger Recommended)
pins: 1, MH

## 59S22B-40MT5-K
designator P?
FaKrA Right Angle Plug, Pin in Paste, Coding K (Curry), Up to 6 GHz, -40 to 105 degC; PartNumber: 59S22B-40MT5-K; Design Note: Footprint in library is a generic example - only application specific footprint delivers High Performance; DatasheetVersion: b00; PackageVersion: b00; PackageReference: 59S22B-40MT5-K; PackageDescription: FaKra-HF Right Angle Plug, Pin in Paste, 22.75 x 8 x 9.8 mm; Coding: K (Curry); Mounting Technology: Pin-in-Paste; ComponentLink1Description: Manufacturer URL; ComponentLink1URL: http://www.rosenberger.de; ComponentLink2Description: Datasheet; ComponentLink2URL: http://rosenberger.de/ok/images/documents/db/59S22B-40MT5-Y.pdf; ComponentLink3Description: Package Specification; ComponentLink3URL: http://rosenberger.de/ok/images/documents/db/59S22B-40MT5-Y.pdf; ComponentLink4Description: Series Overview / Design Note; ComponentLink4URL: http://rosenberger.de/ok/images/documents/spez/59fakra.pdf; ComponentLink5Description: Webshop / RFQ; ComponentLink5URL: http://www.rosenberger.com/en/contact/sales/
footprint ROS-59S22B-40MT5-K_V (FaKra-HF Right Angle Plug, Pin in Paste, 22.75x8x9.8mm, Rosenberger Recommended)
pins: 1, MH

## 59S22B-40MT5-M
designator P?
FaKrA Right Angle Plug, Pin in Paste, Coding M (Pastel-Orange), Up to 6 GHz, -40 to 105 degC; PartNumber: 59S22B-40MT5-M; Coding: M (Pastel Orange); Design Note: Footprint in library is a generic example - only application specific footprint delivers High Performance; DatasheetVersion: b00; PackageVersion: b00; PackageReference: 59S22B-40MT5-M; PackageDescription: FaKra-HF Right Angle Plug, Pin in Paste, 22.75 x 8 x 9.8 mm; Mounting Technology: Pin-in-Paste; ComponentLink1Description: Manufacturer URL; ComponentLink1URL: http://www.rosenberger.de; ComponentLink2Description: Datasheet; ComponentLink2URL: http://rosenberger.de/ok/images/documents/db/59S22B-40MT5-Y.pdf; ComponentLink3Description: Package Specification; ComponentLink3URL: http://rosenberger.de/ok/images/documents/db/59S22B-40MT5-Y.pdf; ComponentLink4Description: Series Overview / Design Note; ComponentLink4URL: http://rosenberger.de/ok/images/documents/spez/59fakra.pdf; ComponentLink5Description: Webshop / RFQ; ComponentLink5URL: http://www.rosenberger.com/en/contact/sales/
footprint ROS-59S22B-40MT5-M_V (FaKra-HF Right Angle Plug, Pin in Paste, 22.75x8x9.8mm, Rosenberger Recommended)
pins: 1, MH

## 59S22B-40MT5-Z
designator P?
FaKrA Right Angle Plug, Pin in Paste, Coding Z (Waterblue), Up to 6 GHz, -40 to 105 degC; PartNumber: 59S22B-40MT5-Z; Design Note: Footprint in library is a generic example - only application specific footprint delivers High Performance; DatasheetVersion: b00; PackageVersion: b00; PackageReference: 59S22B-40MT5-Z; PackageDescription: FaKra-HF Right Angle Plug, Pin in Paste, 22.75 x 8 x 9.8 mm; Coding: Z (Waterblue); Mounting Technology: Pin-in-Paste; ComponentLink1Description: Manufacturer URL; ComponentLink1URL: http://www.rosenberger.de; ComponentLink2Description: Datasheet; ComponentLink2URL: http://rosenberger.de/ok/images/documents/db/59S22B-40MT5-Y.pdf; ComponentLink3Description: Package Specification; ComponentLink3URL: http://rosenberger.de/ok/images/documents/db/59S22B-40MT5-Y.pdf; ComponentLink4Description: Series Overview / Design Note; ComponentLink4URL: http://rosenberger.de/ok/images/documents/spez/59fakra.pdf; ComponentLink5Description: Webshop / RFQ; ComponentLink5URL: http://www.rosenberger.com/en/contact/sales/
footprint ROS-59S22B-40MT5-Z_V (FaKra-HF Right Angle Plug, Pin in Paste, 22.75x8x9.8mm, Rosenberger Recommended)
pins: 1, MH

## 59S225-400L5
designator P?
SMB Right Angle Plug, Up to 4 GHz, -55 to 155 degC; PartNumber: 59S225-400L5; Design Note: Footprint in library is a generic example - only application specific footprint delivers High Performance; DatasheetVersion: a00; PackageVersion: a00; PackageReference: 59S225-400L5; PackageDescription: SMB Right Angle Plug, 14.5 x 6 x 8.3 mm; Mounting Technology: Through Hole; ComponentLink1Description: Manufacturer URL; ComponentLink1URL: http://www.rosenberger.de; ComponentLink2Description: Datasheet; ComponentLink2URL: http://rosenberger.de/ok/images/documents/db/59S225-400L5.pdf; ComponentLink3Description: Package Specification; ComponentLink3URL: http://rosenberger.de/ok/images/documents/db/59S225-400L5.pdf; ComponentLink4Description: Series Overview / Design Note; ComponentLink4URL: http://rosenberger.de/ok/images/documents/spez/59FaKrA.pd; ComponentLink5Description: Webshop / RFQ; ComponentLink5URL: http://www.rosenberger.com/en/contact/sales/
footprint ROS-59S225-400L5_V (SMB Right Angle Plug, 14.5x6x8.3mm, Rosenberger Recommended)
pins: 1, MH